# Altium footprint library ThanhNT.PcbLib: 579 footprints (part 37 of 37)
Each footprint in its own frame and in the unit in brackets; x right, y up, seen from the top. Pads: shape width x height; smd on the part's side, far side on the other; paste and mask are expansions set on the pad; w line width, h text height; cw(c..) or ccw(c..) is an arc to the next point about the centre after c.
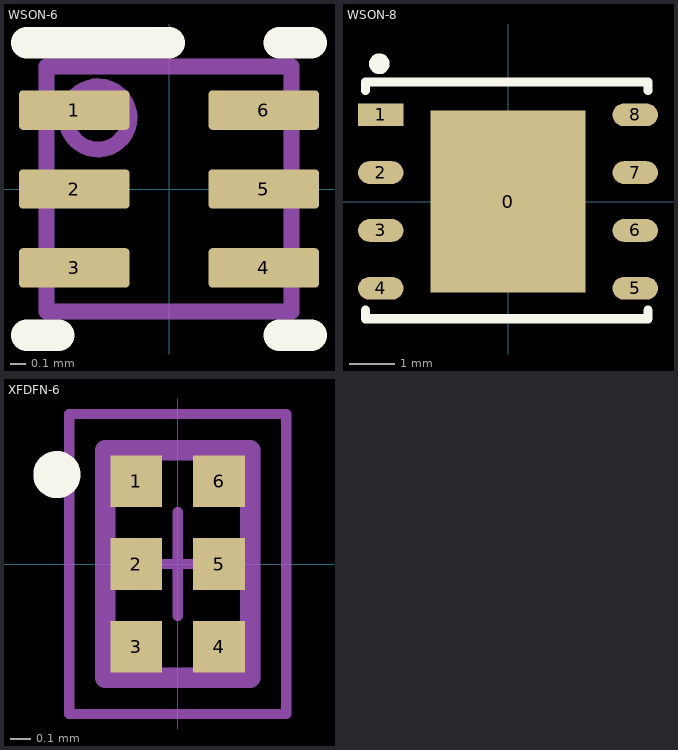
[diagram p36: the footprints below, top view; thin cyan lines are the x and y axes]

## WSON-6 [mm]
pads (6):
  rrect20% 0.7x0.25 smd paste-0.102 mask+0.051: 1(-0.6,0.5) 2(-0.6,0) 3(-0.6,-0.5) 4(0.6,-0.5) 5(0.6,0) 6(0.6,0.5)
Top Overlay:
  lines w0.2: -0.9,-0.925 -0.7,-0.925 ; -0.9,0.925 0,0.925 ; 0.7,-0.925 0.9,-0.925 ; 0.7,0.925 0.9,0.925
Mechanical 13:
  circle w0.1: c-0.45,0.45 r0.2
  lines w0.1: -0.775,-0.775 -0.775,0.775 0.775,0.775 0.775,-0.775 -0.775,-0.775
3D body "DSE0006A.stp": height 0.81, standoff 0.01, extent -0.75,-0.75 0.75,0.75

## WSON-8 [mm]
pads (9):
  rect 3.4x4 smd: 0(0,0)
  rect 1x0.5 smd: 1(-2.794,1.905)
  oval 1x0.5 smd: 2(-2.794,0.635) 3(-2.794,-0.635) 4(-2.794,-1.905) 5(2.794,-1.905) 6(2.794,-0.635) 7(2.794,0.635) 8(2.794,1.905)
Top Overlay:
  circle w0.254: c-2.825,3.025 r0.1
  lines w0.2: -3.125,-2.388 -3.125,-2.575 3.075,-2.575 3.075,-2.388 ; -3.125,2.438 -3.125,2.625 3.075,2.625 3.075,2.438
3D body "User Library-WSON-8.STEP": height 0.81, standoff 0.01, extent -3.003,-2.5 2.997,2.5

## XFDFN-6 [mm] "TSLP, 6-Leads, Body 0.7x1.1 mm"
height 0.4
pads (6):
  rect 0.25x0.25 smd: 1(-0.2,0.4) 2(-0.2,0) 3(-0.2,-0.4) 4(0.2,-0.4) 5(0.2,0) 6(0.2,0.4)
Top Overlay:
  circle w0.178: c-0.584,0.432 r0.025
Mechanical 13:
  lines w0.1: -0.35,-0.55 -0.35,0.55 0.35,0.55 0.35,-0.55 -0.35,-0.55
Mechanical 15:
  lines w0.05: -0.25,0 0.25,0 ; 0,-0.25 0,0.25 ; -0.525,-0.725 -0.525,0.725 0.525,0.725 0.525,-0.725 -0.525,-0.725
3D body: height 0.4, standoff 0, extent -0.35,-0.55 0.35,0.55